# Altium footprint library 14-Inductors.PcbLib: 164 footprints (part 11 of 11)
Each footprint in its own frame and in the unit in brackets; x right, y up, seen from the top. Pads: shape width x height; smd on the part's side, far side on the other; paste and mask are expansions set on the pad; w line width, h text height; cw(c..) or ccw(c..) is an arc to the next point about the centre after c.
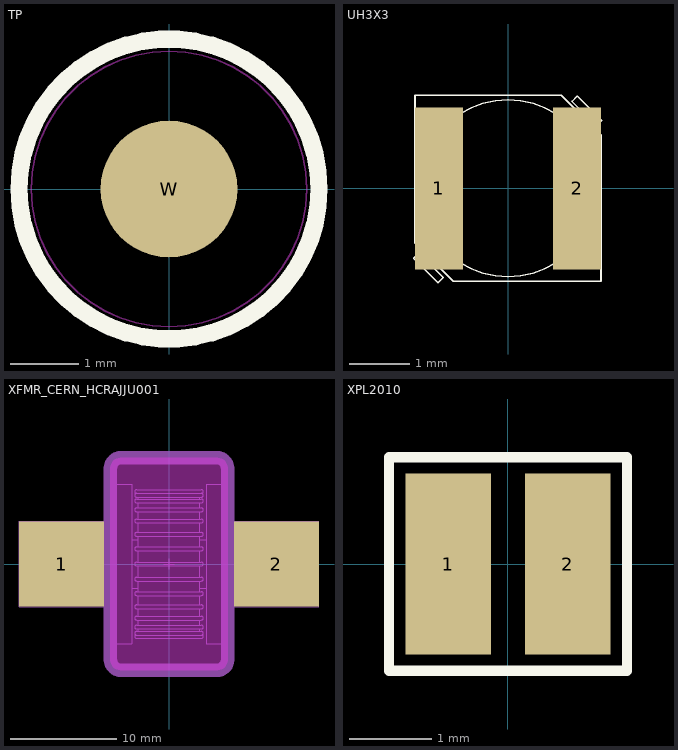
[diagram p10: the footprints below, top view; thin cyan lines are the x and y axes]

## TP [mm]
height 11.7
pads (1):
  round 2 smd mask+1: W(0,0)
Top Overlay:
  circle w0.254: c0,0 r2.195
Keep-Out Layer:
  circle w0.025: c0,0 r2.017
3D body "1_016-1_016-3_tp.stp": height 0.02, standoff 0, extent -1.5,-1.5 1.5,1.5

## UH3X3 [mm]
height 3.1
pads (2):
  rect 0.8x2.7 smd mask+0.051: 1(-1.15,0) 2(1.15,0)
Top Overlay:
  circle w0.025: c0,0 r1.473
  lines w0.025: -1.575,-1.168 -1.486,-1.079 -1.079,-1.486 -1.168,-1.575 -1.575,-1.168 ; -1.55,-0.914 -1.55,1.55 0.888,1.55 1.55,0.888 1.55,-1.55 -0.914,-1.55 -1.55,-0.914 ; 1.067,1.448 1.473,1.041 1.562,1.13 1.156,1.537 1.067,1.448
3D body "uh3x3.stp": height 1.2, standoff -0.02, extent -1.55,-1.6 1.55,1.5

## XFMR_CERN_HCRAJJU001 [mm] "CERN HF Current transformer"
height 14
pads (2):
  rect 8x8 smd paste-4 mask+0.1: 1(-10.1,0) 2(10.1,0)
Keep-Out Layer:
  board cut-out: 4.792,9.962 4.974,9.886 5.137,9.777 5.277,9.637 5.386,9.474 5.462,9.292 5.5,9.098 5.5,9 5.5,-9 5.5,-9.098 5.462,-9.292 5.386,-9.474 5.277,-9.637 5.137,-9.777 4.974,-9.886 4.792,-9.962 4.598,-10 -4.598,-10 -4.792,-9.962 -4.974,-9.886 -5.137,-9.777 -5.277,-9.637 -5.386,-9.474 -5.462,-9.292 -5.5,-9.098 -5.5,-9 -5.5,9 -5.5,9.098 -5.462,9.292 -5.386,9.474 -5.277,9.637 -5.137,9.777 -4.974,9.886 -4.792,9.962 -4.598,10 4.598,10
Mechanical 1:
  lines w1.27: -5.5,-9 ccw(c-4.5,-9) -4.5,-10 4.5,-10 ccw(c4.5,-9) 5.5,-9 5.5,9 ccw(c4.5,9) 4.5,10 -4.5,10 ccw(c-4.5,9) -5.5,9 -5.5,-9
Mechanical 8:
  lines w0.1: -10.6,0 -10.1,0 ; -10.1,-0.5 -10.1,0 ; -10.1,0.5 -10.1,0 ; -9.6,0 -10.1,0 ; -0.5,0 0,0 ; 0,-0.5 0,0 ; 0,0.5 0,0 ; 0.5,0 0,0 ; 9.6,0 10.1,0 ; 10.1,-0.5 10.1,0 ; 10.1,0.5 10.1,0 ; 10.6,0 10.1,0 ; -14.1,-4 -6.1,-4 -6.1,4 -14.1,4 -14.1,-4 ; -5.5,-9 ccw(c-4.5,-9) -4.5,-10 4.5,-10 ccw(c4.5,-9) 5.5,-9 5.5,9 ccw(c4.5,9) 4.5,10 -4.5,10 ccw(c-4.5,9) -5.5,9 -5.5,-9 ; 6.1,-4 14.1,-4 14.1,4 6.1,4 6.1,-4
Mechanical 14:
  lines w0.1: -5,-2.3 -8.55,-2.3 -8.55,2.3 -5,2.3 ; -3.5,-2.3 -2.895,-2.3 ; -3.5,2.3 -2.895,2.3 ; -3.138,-6.666 ccw(c-3.05,-6.818) -3.05,-6.993 3.05,-6.993 ccw(c3.05,-6.818) 3.138,-6.666 ; -2.895,-6.34 -2.895,-6.107 ; -2.895,-5.757 -2.895,-5.266 ; -2.895,-4.916 -2.895,-4.201 ; -2.895,-3.851 -2.895,-2.961 ; -2.895,-2.611 -2.895,-1.599 ; -2.895,-1.249 -2.895,-0.175 ; -2.895,0.175 -2.895,1.249 ; -2.895,1.599 -2.895,2.611 ; -2.895,2.961 -2.895,3.87 ; -2.895,4.22 -2.895,4.916 ; -2.895,5.266 -2.895,5.757 ; -2.895,6.107 -2.895,6.286 ; -2.895,6.636 -2.895,6.637 ; 2.895,-6.34 2.895,-6.107 ; 2.895,-5.757 2.895,-5.266 ; 2.895,-4.916 2.895,-4.201 ; 2.895,-3.851 2.895,-2.961 ; 2.895,-2.611 2.895,-1.599 ; 2.895,-2.3 3.5,-2.3 ; 2.895,-1.249 2.895,-0.175 ; 2.895,0.175 2.895,1.249 ; 2.895,1.599 2.895,2.611 ; 2.895,2.3 3.5,2.3 ; 2.895,2.961 2.895,3.87 ; 2.895,4.22 2.895,4.916 ; 2.895,5.266 2.895,5.757 ; 2.895,6.107 2.895,6.286 ; 2.895,6.636 2.895,6.637 ; 5,-2.3 8.55,-2.3 8.55,2.3 5,2.3 ; -5,-7.5 -3.5,-7.5 -3.5,7.5 -5,7.5 -5,-7.5 ; -3.05,-6.69 cw(c-3.05,-6.515) -3.05,-6.34 3.05,-6.34 cw(c3.05,-6.515) 3.05,-6.69 -3.05,-6.69 ; -3.05,-6.107 cw(c-3.05,-5.932) -3.05,-5.757 3.05,-5.757 cw(c3.05,-5.932) 3.05,-6.107 -3.05,-6.107 ; -3.05,-5.266 cw(c-3.05,-5.091) -3.05,-4.916 3.05,-4.916 cw(c3.05,-5.091) 3.05,-5.266 -3.05,-5.266 ; -3.05,-4.201 cw(c-3.05,-4.026) -3.05,-3.851 3.05,-3.851 cw(c3.05,-4.026) 3.05,-4.201 -3.05,-4.201 ; -3.05,-2.961 cw(c-3.05,-2.786) -3.05,-2.611 3.05,-2.611 cw(c3.05,-2.786) 3.05,-2.961 -3.05,-2.961 ; -3.05,-1.599 cw(c-3.05,-1.424) -3.05,-1.249 3.05,-1.249 cw(c3.05,-1.424) 3.05,-1.599 -3.05,-1.599 ; -3.05,-0.175 cw(c-3.05,0) -3.05,0.175 3.05,0.175 cw(c3.05,0) 3.05,-0.175 -3.05,-0.175 ; -3.05,1.249 cw(c-3.05,1.424) -3.05,1.599 3.05,1.599 cw(c3.05,1.424) 3.05,1.249 -3.05,1.249 ; -3.05,2.611 cw(c-3.05,2.786) -3.05,2.961 3.05,2.961 cw(c3.05,2.786) 3.05,2.611 -3.05,2.611 ; -3.05,3.87 cw(c-3.05,4.045) -3.05,4.22 3.05,4.22 cw(c3.05,4.045) 3.05,3.87 -3.05,3.87 ; -3.05,4.916 cw(c-3.05,5.091) -3.05,5.266 3.05,5.266 cw(c3.05,5.091) 3.05,4.916 -3.05,4.916 ; -3.05,5.757 cw(c-3.05,5.932) -3.05,6.107 3.05,6.107 cw(c3.05,5.932) 3.05,5.757 -3.05,5.757 ; -3.05,6.286 cw(c-3.05,6.461) -3.05,6.636 3.05,6.636 cw(c3.05,6.461) 3.05,6.286 -3.05,6.286 ; -3.05,6.637 cw(c-3.05,6.812) -3.05,6.987 3.05,6.987 cw(c3.05,6.812) 3.05,6.637 -3.05,6.637 ; 3.5,-7.5 5,-7.5 5,7.5 3.5,7.5 3.5,-7.5
Drill Drawing:
  lines w0.1: -4.56,4.658 -5.5,5 ; -4.56,5.342 -5.5,5 ; -2.342,-9.06 -2,-10 ; -2.342,9.06 -2,10 ; -1.658,-9.06 -2,-10 ; -1.658,9.06 -2,10 ; -0.5,0 0,0 ; 0,-0.5 0,0 ; 0,0.5 0,0 ; 0.5,0 0,0 ; 1.224,-8.224 3.774,-8.224 5.225,-9.675 ; 4.319,-9.252 5.225,-9.675 ; 4.56,4.658 5.5,5 ; 4.56,5.342 5.5,5 ; 4.802,-8.769 5.225,-9.675 ; -5.5,5 5.5,5 ; -2,-10 -2,10 ; -5.5,-9 ccw(c-4.5,-9) -4.5,-10 4.5,-10 ccw(c4.5,-9) 5.5,-9 5.5,9 ccw(c4.5,9) 4.5,10 -4.5,10 ccw(c-4.5,9) -5.5,9 -5.5,-9
  text "r1" at 1.892,-8.014 h1
  text "20" at -2.209,-2.791 h1
  text "11" at 0.797,5.209 h1
3D body "XFMR_CERN_HCRAJJU001.stp": height 7.5, standoff -7.5, extent -8.55,-7.5 8.55,7.5

## XPL2010 [mm]
height 3.1
pads (2):
  rect 1.04x2.2 smd: 1(-0.725,0) 2(0.725,0)
Top Overlay:
  lines w0.127: -1.448,-1.297 1.448,-1.297 1.448,1.3 -1.448,1.3 -1.448,-1.297
3D body "xpl2010.stp": height 1, standoff 0, extent -1,-0.951 1,0.949